# Altium footprint library THU VIEN V1.PcbLib: 400 footprints (part 13 of 25)
Each footprint in its own frame and in the unit in brackets; x right, y up, seen from the top. Pads: shape width x height; smd on the part's side, far side on the other; paste and mask are expansions set on the pad; w line width, h text height; cw(c..) or ccw(c..) is an arc to the next point about the centre after c.
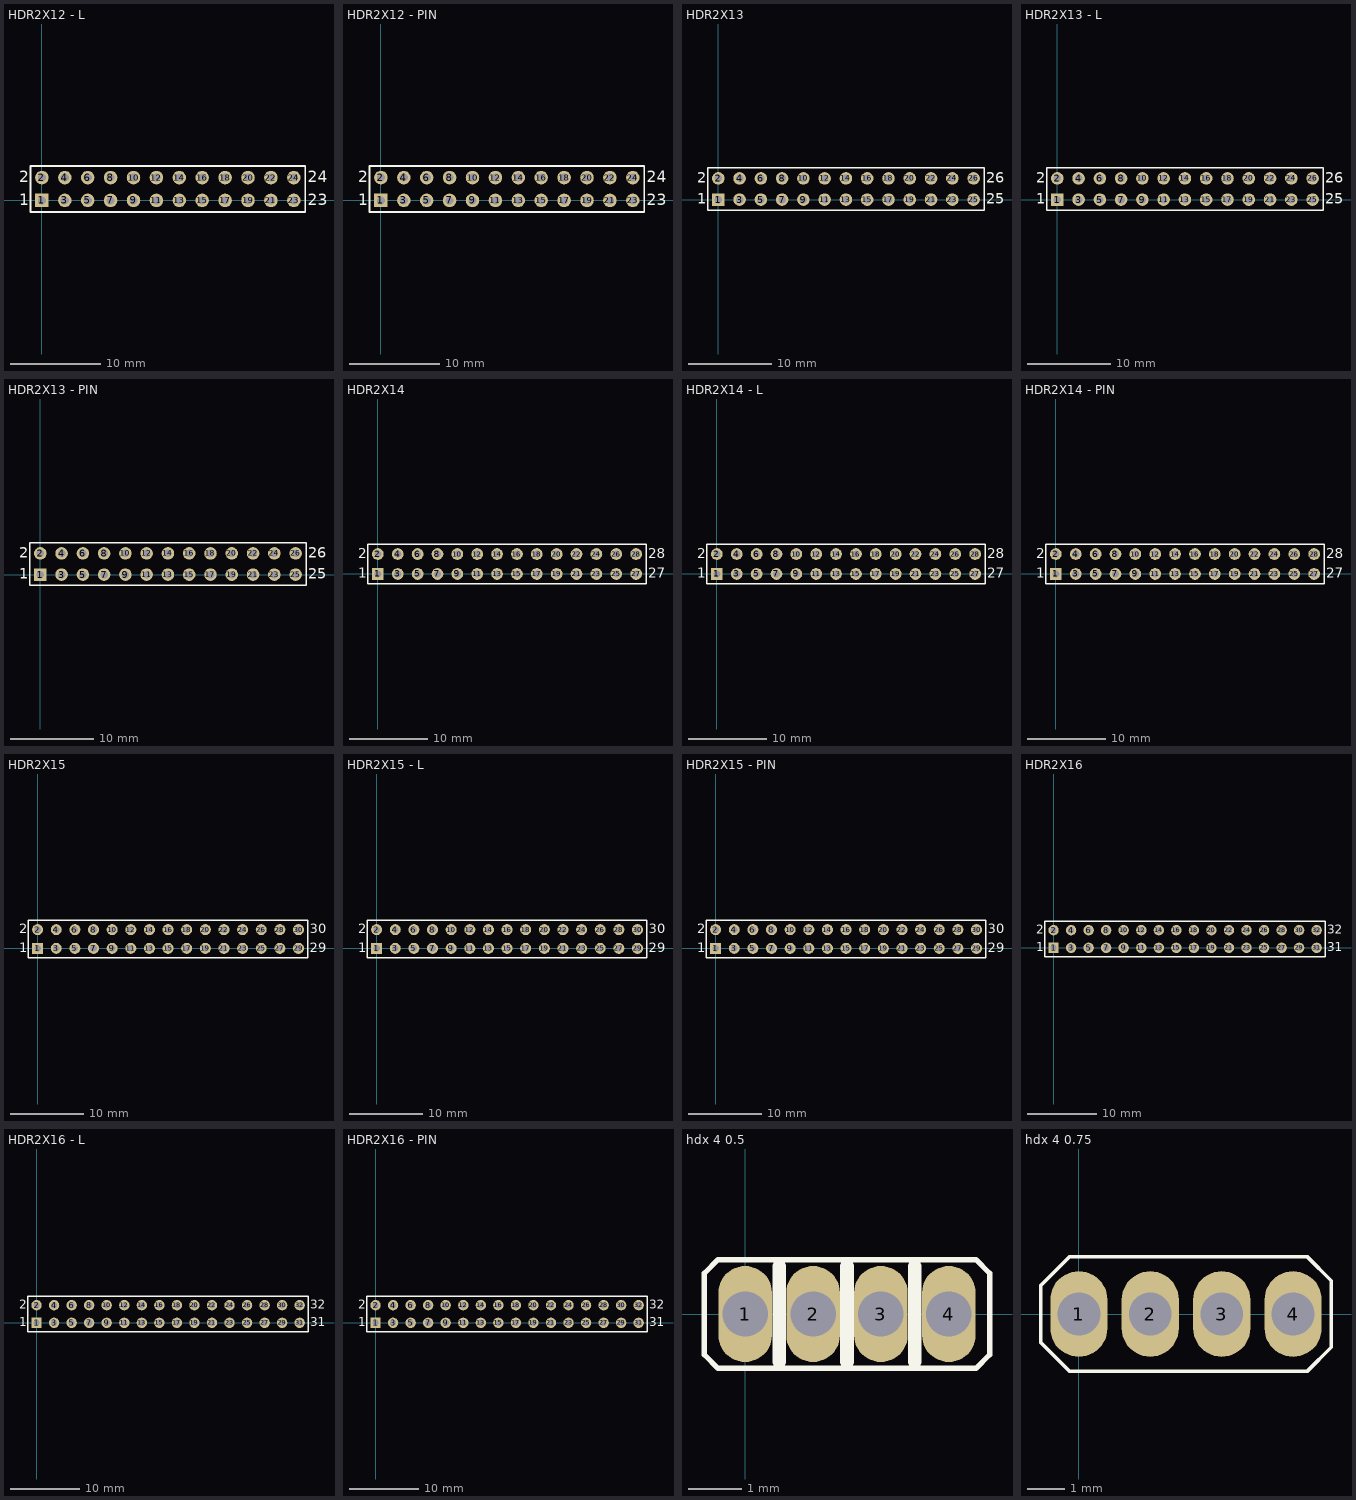
[diagram p12: the footprints below, top view; thin cyan lines are the x and y axes]

## HDR2X12 - L [mm] "Connector; Header; 12x2 Position"
pads (24):
  rect 1.5x1.5 hole 0.9: 1(0,0)
  round 1.5 hole 0.9: 2(0,2.54) 3(2.54,0) 4(2.54,2.54) 5(5.08,0) 6(5.08,2.54) 7(7.62,0) 8(7.62,2.54) 9(10.16,0) 10(10.16,2.54) 11(12.7,0) 12(12.7,2.54) 13(15.24,0) 14(15.24,2.54) 15(17.78,0) 16(17.78,2.54) 17(20.32,0) 18(20.32,2.54) 19(22.86,0) 20(22.86,2.54) 21(25.4,0) 22(25.4,2.54) 23(27.94,0) 24(27.94,2.54)
Top Overlay:
  lines w0.2: -1.27,-1.27 29.21,-1.27 29.21,3.81 -1.27,3.81 -1.27,-1.27
  text "24" at 29.464,2.032 h1.27
  text "23" at 29.464,-0.508 h1.27
  text "2" at -2.54,2.032 h1.27
  text "1" at -2.54,-0.508 h1.27
3D body: height 3.2, standoff -5.08, extent 26.594,-9.435 29.134,2.984
3D body: height 3.2, standoff -5.08, extent 24.054,-9.435 26.594,2.984
3D body: height 3.2, standoff -5.08, extent 21.514,-9.435 24.054,2.984
3D body: height 3.2, standoff -5.08, extent 18.974,-9.435 21.514,2.984
3D body: height 3.2, standoff -5.08, extent 16.459,-9.435 18.999,2.984
3D body: height 3.2, standoff -5.08, extent 13.97,-9.435 16.51,2.984
3D body: height 3.2, standoff -5.08, extent 11.43,-9.435 13.97,2.984
3D body: height 3.2, standoff -5.08, extent 8.915,-9.435 11.455,2.984
3D body: height 3.2, standoff -5.08, extent 6.375,-9.435 8.915,2.984
3D body: height 3.2, standoff -5.08, extent 3.861,-9.435 6.401,2.984
3D body: height 3.2, standoff -5.08, extent 1.346,-9.435 3.886,2.984
3D body: height 3.2, standoff -5.08, extent -1.143,-9.435 1.397,2.984

## HDR2X12 - PIN [mm] "Connector; Header; 12x2 Position"
pads (24):
  rect 1.5x1.5 hole 0.9: 1(0,0)
  round 1.5 hole 0.9: 2(0,2.54) 3(2.54,0) 4(2.54,2.54) 5(5.08,0) 6(5.08,2.54) 7(7.62,0) 8(7.62,2.54) 9(10.16,0) 10(10.16,2.54) 11(12.7,0) 12(12.7,2.54) 13(15.24,0) 14(15.24,2.54) 15(17.78,0) 16(17.78,2.54) 17(20.32,0) 18(20.32,2.54) 19(22.86,0) 20(22.86,2.54) 21(25.4,0) 22(25.4,2.54) 23(27.94,0) 24(27.94,2.54)
Top Overlay:
  lines w0.2: -1.27,-1.27 -1.27,3.81 29.21,3.81 29.21,-1.27 -1.27,-1.27
  text "1" at -2.54,-0.508 h1.27
  text "2" at -2.54,2.032 h1.27
  text "23" at 29.464,-0.508 h1.27
  text "24" at 29.464,2.032 h1.27
3D body: height 6.02, standoff -3.1, extent 26.543,-1.27 29.083,3.81
3D body: height 6.02, standoff -3.1, extent 24.003,-1.27 26.543,3.81
3D body: height 6.02, standoff -3.1, extent 21.463,-1.27 24.003,3.81
3D body: height 6.02, standoff -3.1, extent 18.948,-1.27 21.488,3.81
3D body: height 6.02, standoff -3.1, extent 16.408,-1.27 18.948,3.81
3D body: height 6.02, standoff -3.1, extent 13.868,-1.27 16.408,3.81
3D body: height 6.02, standoff -3.1, extent 11.354,-1.27 13.894,3.81
3D body: height 6.02, standoff -3.1, extent 8.839,-1.27 11.379,3.81
3D body: height 6.02, standoff -3.1, extent 6.325,-1.27 8.865,3.81
3D body: height 6.02, standoff -3.1, extent 3.81,-1.27 6.35,3.81
3D body: height 6.02, standoff -3.1, extent 1.27,-1.27 3.81,3.81
3D body: height 6.02, standoff -3.1, extent -1.245,-1.27 1.295,3.81

## HDR2X13 [mm] "Connector; Header; 13x2 Position"
pads (26):
  rect 1.5x1.5 hole 0.9: 1(0,0)
  round 1.5 hole 0.9: 2(0,2.54) 3(2.54,0) 4(2.54,2.54) 5(5.08,0) 6(5.08,2.54) 7(7.62,0) 8(7.62,2.54) 9(10.16,0) 10(10.16,2.54) 11(12.7,0) 12(12.7,2.54) 13(15.24,0) 14(15.24,2.54) 15(17.78,0) 16(17.78,2.54) 17(20.32,0) 18(20.32,2.54) 19(22.86,0) 20(22.86,2.54) 21(25.4,0) 22(25.4,2.54) 23(27.94,0) 24(27.94,2.54) 25(30.48,0) 26(30.48,2.54)
Top Overlay:
  lines w0.2: -1.27,-1.27 31.75,-1.27 31.75,3.81 -1.27,3.81 -1.27,-1.27
  text "26" at 32.004,2.032 h1.27
  text "25" at 32.004,-0.508 h1.27
  text "1" at -2.54,-0.508 h1.27
  text "2" at -2.54,2.032 h1.27
3D body: height 8.4, standoff -3, extent 18.974,-1.23 31.674,3.77
3D body: height 8.4, standoff -3, extent 6.274,-1.23 18.974,3.77
3D body: height 8.4, standoff -3, extent -1.321,-1.23 6.299,3.77

## HDR2X13 - L [mm] "Connector; Header; 13x2 Position"
pads (26):
  rect 1.5x1.5 hole 0.9: 1(0,0)
  round 1.5 hole 0.9: 2(0,2.54) 3(2.54,0) 4(2.54,2.54) 5(5.08,0) 6(5.08,2.54) 7(7.62,0) 8(7.62,2.54) 9(10.16,0) 10(10.16,2.54) 11(12.7,0) 12(12.7,2.54) 13(15.24,0) 14(15.24,2.54) 15(17.78,0) 16(17.78,2.54) 17(20.32,0) 18(20.32,2.54) 19(22.86,0) 20(22.86,2.54) 21(25.4,0) 22(25.4,2.54) 23(27.94,0) 24(27.94,2.54) 25(30.48,0) 26(30.48,2.54)
Top Overlay:
  lines w0.2: -1.27,-1.27 31.75,-1.27 31.75,3.81 -1.27,3.81 -1.27,-1.27
  text "26" at 32.004,2.032 h1.27
  text "25" at 32.004,-0.508 h1.27
  text "1" at -2.54,-0.508 h1.27
  text "2" at -2.54,2.032 h1.27
3D body: height 3.2, standoff -5.08, extent 29.134,-9.41 31.674,3.009
3D body: height 3.2, standoff -5.08, extent 26.619,-9.41 29.159,3.009
3D body: height 3.2, standoff -5.08, extent 24.079,-9.41 26.619,3.009
3D body: height 3.2, standoff -5.08, extent 21.539,-9.41 24.079,3.009
3D body: height 3.2, standoff -5.08, extent 18.999,-9.41 21.539,3.009
3D body: height 3.2, standoff -5.08, extent 16.459,-9.41 18.999,3.009
3D body: height 3.2, standoff -5.08, extent 13.97,-9.41 16.51,3.009
3D body: height 3.2, standoff -5.08, extent 11.43,-9.41 13.97,3.009
3D body: height 3.2, standoff -5.08, extent 8.89,-9.41 11.43,3.009
3D body: height 3.2, standoff -5.08, extent 6.35,-9.41 8.89,3.009
3D body: height 3.2, standoff -5.08, extent 3.81,-9.41 6.35,3.009
3D body: height 3.2, standoff -5.08, extent 1.321,-9.41 3.861,3.009
3D body: height 3.2, standoff -5.08, extent -1.219,-9.41 1.321,3.009

## HDR2X13 - PIN [mm] "Connector; Header; 13x2 Position"
pads (26):
  rect 1.5x1.5 hole 0.9: 1(0,0)
  round 1.5 hole 0.9: 2(0,2.54) 3(2.54,0) 4(2.54,2.54) 5(5.08,0) 6(5.08,2.54) 7(7.62,0) 8(7.62,2.54) 9(10.16,0) 10(10.16,2.54) 11(12.7,0) 12(12.7,2.54) 13(15.24,0) 14(15.24,2.54) 15(17.78,0) 16(17.78,2.54) 17(20.32,0) 18(20.32,2.54) 19(22.86,0) 20(22.86,2.54) 21(25.4,0) 22(25.4,2.54) 23(27.94,0) 24(27.94,2.54) 25(30.48,0) 26(30.48,2.54)
Top Overlay:
  lines w0.2: -1.27,-1.27 31.75,-1.27 31.75,3.81 -1.27,3.81 -1.27,-1.27
  text "26" at 32.004,2.032 h1.27
  text "25" at 32.004,-0.508 h1.27
  text "1" at -2.54,-0.508 h1.27
  text "2" at -2.54,2.032 h1.27
3D body: height 6.02, standoff -3.1, extent -1.245,-1.27 1.295,3.81
3D body: height 6.02, standoff -3.1, extent 1.295,-1.27 3.835,3.81
3D body: height 6.02, standoff -3.1, extent 3.835,-1.27 6.375,3.81
3D body: height 6.02, standoff -3.1, extent 6.375,-1.27 8.915,3.81
3D body: height 6.02, standoff -3.1, extent 8.915,-1.27 11.455,3.81
3D body: height 6.02, standoff -3.1, extent 11.455,-1.27 13.995,3.81
3D body: height 6.02, standoff -3.1, extent 13.995,-1.27 16.535,3.81
3D body: height 6.02, standoff -3.1, extent 16.535,-1.27 19.075,3.81
3D body: height 6.02, standoff -3.1, extent 19.025,-1.27 21.565,3.81
3D body: height 6.02, standoff -3.1, extent 21.488,-1.27 24.028,3.81
3D body: height 6.02, standoff -3.1, extent 24.028,-1.27 26.568,3.81
3D body: height 6.02, standoff -3.1, extent 26.568,-1.27 29.108,3.81
3D body: height 6.02, standoff -3.1, extent 29.108,-1.27 31.648,3.81

## HDR2X14 [mm] "Connector; Header; 14x2 Position"
pads (28):
  rect 1.5x1.5 hole 0.9: 1(0,0)
  round 1.5 hole 0.9: 2(0,2.54) 3(2.54,0) 4(2.54,2.54) 5(5.08,0) 6(5.08,2.54) 7(7.62,0) 8(7.62,2.54) 9(10.16,0) 10(10.16,2.54) 11(12.7,0) 12(12.7,2.54) 13(15.24,0) 14(15.24,2.54) 15(17.78,0) 16(17.78,2.54) 17(20.32,0) 18(20.32,2.54) 19(22.86,0) 20(22.86,2.54) 21(25.4,0) 22(25.4,2.54) 23(27.94,0) 24(27.94,2.54) 25(30.48,0) 26(30.48,2.54) 27(33.02,0) 28(33.02,2.54)
Top Overlay:
  lines w0.2: -1.27,-1.27 -1.27,3.81 34.29,3.81 34.29,-1.27 -1.27,-1.27
  text "2" at -2.54,2.032 h1.27
  text "1" at -2.54,-0.508 h1.27
  text "27" at 34.544,-0.508 h1.27
  text "28" at 34.544,2.032 h1.27
3D body: height 8.4, standoff -3, extent 21.615,-1.23 34.315,3.77
3D body: height 8.4, standoff -3, extent 8.915,-1.23 21.615,3.77
3D body: height 8.4, standoff -3, extent -1.27,-1.23 8.89,3.77

## HDR2X14 - L [mm] "Connector; Header; 14x2 Position"
pads (28):
  rect 1.5x1.5 hole 0.9: 1(0,0)
  round 1.5 hole 0.9: 2(0,2.54) 3(2.54,0) 4(2.54,2.54) 5(5.08,0) 6(5.08,2.54) 7(7.62,0) 8(7.62,2.54) 9(10.16,0) 10(10.16,2.54) 11(12.7,0) 12(12.7,2.54) 13(15.24,0) 14(15.24,2.54) 15(17.78,0) 16(17.78,2.54) 17(20.32,0) 18(20.32,2.54) 19(22.86,0) 20(22.86,2.54) 21(25.4,0) 22(25.4,2.54) 23(27.94,0) 24(27.94,2.54) 25(30.48,0) 26(30.48,2.54) 27(33.02,0) 28(33.02,2.54)
Top Overlay:
  lines w0.2: -1.27,-1.27 34.29,-1.27 34.29,3.81 -1.27,3.81 -1.27,-1.27
  text "28" at 34.544,2.032 h1.27
  text "27" at 34.544,-0.508 h1.27
  text "1" at -2.54,-0.508 h1.27
  text "2" at -2.54,2.032 h1.27
3D body: height 3.2, standoff -5.08, extent 31.674,-9.537 34.214,2.882
3D body: height 3.2, standoff -5.08, extent 29.159,-9.537 31.699,2.882
3D body: height 3.2, standoff -5.08, extent 26.619,-9.537 29.159,2.882
3D body: height 3.2, standoff -5.08, extent 24.105,-9.537 26.645,2.882
3D body: height 3.2, standoff -5.08, extent 21.565,-9.537 24.105,2.882
3D body: height 3.2, standoff -5.08, extent 19.025,-9.537 21.565,2.882
3D body: height 3.2, standoff -5.08, extent 16.485,-9.537 19.025,2.882
3D body: height 3.2, standoff -5.08, extent 13.945,-9.537 16.485,2.882
3D body: height 3.2, standoff -5.08, extent 11.405,-9.537 13.945,2.882
3D body: height 3.2, standoff -5.08, extent 8.865,-9.537 11.405,2.882
3D body: height 3.2, standoff -5.08, extent 6.325,-9.537 8.865,2.882
3D body: height 3.2, standoff -5.08, extent 3.785,-9.537 6.325,2.882
3D body: height 3.2, standoff -5.08, extent 1.295,-9.537 3.835,2.882
3D body: height 3.2, standoff -5.08, extent -1.194,-9.537 1.346,2.882

## HDR2X14 - PIN [mm] "Connector; Header; 14x2 Position"
pads (28):
  rect 1.5x1.5 hole 0.9: 1(0,0)
  round 1.5 hole 0.9: 2(0,2.54) 3(2.54,0) 4(2.54,2.54) 5(5.08,0) 6(5.08,2.54) 7(7.62,0) 8(7.62,2.54) 9(10.16,0) 10(10.16,2.54) 11(12.7,0) 12(12.7,2.54) 13(15.24,0) 14(15.24,2.54) 15(17.78,0) 16(17.78,2.54) 17(20.32,0) 18(20.32,2.54) 19(22.86,0) 20(22.86,2.54) 21(25.4,0) 22(25.4,2.54) 23(27.94,0) 24(27.94,2.54) 25(30.48,0) 26(30.48,2.54) 27(33.02,0) 28(33.02,2.54)
Top Overlay:
  lines w0.2: -1.27,-1.27 -1.27,3.81 34.29,3.81 34.29,-1.27 -1.27,-1.27
  text "2" at -2.54,2.032 h1.27
  text "1" at -2.54,-0.508 h1.27
  text "27" at 34.544,-0.508 h1.27
  text "28" at 34.544,2.032 h1.27
3D body: height 6.02, standoff -3.1, extent -1.168,-1.27 1.372,3.81
3D body: height 6.02, standoff -3.1, extent 1.346,-1.27 3.886,3.81
3D body: height 6.02, standoff -3.1, extent 3.861,-1.27 6.401,3.81
3D body: height 6.02, standoff -3.1, extent 6.401,-1.27 8.941,3.81
3D body: height 6.02, standoff -3.1, extent 8.915,-1.27 11.455,3.81
3D body: height 6.02, standoff -3.1, extent 11.455,-1.27 13.995,3.81
3D body: height 6.02, standoff -3.1, extent 13.995,-1.27 16.535,3.81
3D body: height 6.02, standoff -3.1, extent 16.535,-1.27 19.075,3.81
3D body: height 6.02, standoff -3.1, extent 19.075,-1.27 21.615,3.81
3D body: height 6.02, standoff -3.1, extent 21.615,-1.27 24.155,3.81
3D body: height 6.02, standoff -3.1, extent 24.105,-1.27 26.645,3.81
3D body: height 6.02, standoff -3.1, extent 26.619,-1.27 29.159,3.81
3D body: height 6.02, standoff -3.1, extent 29.134,-1.27 31.674,3.81
3D body: height 6.02, standoff -3.1, extent 31.648,-1.27 34.188,3.81

## HDR2X15 [mm] "Connector; Header; 15x2 Position"
pads (30):
  rect 1.5x1.5 hole 0.9: 1(0,0)
  round 1.5 hole 0.9: 2(0,2.54) 3(2.54,0) 4(2.54,2.54) 5(5.08,0) 6(5.08,2.54) 7(7.62,0) 8(7.62,2.54) 9(10.16,0) 10(10.16,2.54) 11(12.7,0) 12(12.7,2.54) 13(15.24,0) 14(15.24,2.54) 15(17.78,0) 16(17.78,2.54) 17(20.32,0) 18(20.32,2.54) 19(22.86,0) 20(22.86,2.54) 21(25.4,0) 22(25.4,2.54) 23(27.94,0) 24(27.94,2.54) 25(30.48,0) 26(30.48,2.54) 27(33.02,0) 28(33.02,2.54) 29(35.56,0) 30(35.56,2.54)
Top Overlay:
  lines w0.2: -1.27,-1.27 -1.27,3.81 36.83,3.81 36.83,-1.27 -1.27,-1.27
  text "30" at 37.084,2.032 h1.27
  text "29" at 37.084,-0.508 h1.27
  text "2" at -2.54,2.032 h1.27
  text "1" at -2.54,-0.508 h1.27
3D body: height 8.4, standoff -3, extent 24.054,-1.23 36.754,3.77
3D body: height 8.4, standoff -3, extent 11.328,-1.23 24.028,3.77
3D body: height 8.4, standoff -3, extent -1.244,-1.23 11.456,3.77

## HDR2X15 - L [mm] "Connector; Header; 15x2 Position"
pads (30):
  rect 1.5x1.5 hole 0.9: 1(0,0)
  round 1.5 hole 0.9: 2(0,2.54) 3(2.54,0) 4(2.54,2.54) 5(5.08,0) 6(5.08,2.54) 7(7.62,0) 8(7.62,2.54) 9(10.16,0) 10(10.16,2.54) 11(12.7,0) 12(12.7,2.54) 13(15.24,0) 14(15.24,2.54) 15(17.78,0) 16(17.78,2.54) 17(20.32,0) 18(20.32,2.54) 19(22.86,0) 20(22.86,2.54) 21(25.4,0) 22(25.4,2.54) 23(27.94,0) 24(27.94,2.54) 25(30.48,0) 26(30.48,2.54) 27(33.02,0) 28(33.02,2.54) 29(35.56,0) 30(35.56,2.54)
Top Overlay:
  lines w0.2: -1.27,-1.27 -1.27,3.81 36.83,3.81 36.83,-1.27 -1.27,-1.27
  text "30" at 37.084,2.032 h1.27
  text "29" at 37.084,-0.508 h1.27
  text "2" at -2.54,2.032 h1.27
  text "1" at -2.54,-0.508 h1.27
3D body: height 3.2, standoff -5.08, extent 34.188,-9.384 36.728,3.034
3D body: height 3.2, standoff -5.08, extent 31.648,-9.41 34.188,3.009
3D body: height 3.2, standoff -5.08, extent 29.134,-9.384 31.674,3.034
3D body: height 3.2, standoff -5.08, extent 26.645,-9.384 29.185,3.034
3D body: height 3.2, standoff -5.08, extent 24.105,-9.384 26.645,3.034
3D body: height 3.2, standoff -5.08, extent 21.565,-9.384 24.105,3.034
3D body: height 3.2, standoff -5.08, extent 19.025,-9.384 21.565,3.034
3D body: height 3.2, standoff -5.08, extent 16.485,-9.384 19.025,3.034
3D body: height 3.2, standoff -5.08, extent 13.97,-9.384 16.51,3.034
3D body: height 3.2, standoff -5.08, extent 11.43,-9.384 13.97,3.034
3D body: height 3.2, standoff -5.08, extent 8.89,-9.384 11.43,3.034
3D body: height 3.2, standoff -5.08, extent 6.401,-9.384 8.941,3.034
3D body: height 3.2, standoff -5.08, extent 3.861,-9.384 6.401,3.034
3D body: height 3.2, standoff -5.08, extent 1.321,-9.384 3.861,3.034
3D body: height 3.2, standoff -5.08, extent -1.219,-9.384 1.321,3.034

## HDR2X15 - PIN [mm] "Connector; Header; 15x2 Position"
pads (30):
  rect 1.5x1.5 hole 0.9: 1(0,0)
  round 1.5 hole 0.9: 2(0,2.54) 3(2.54,0) 4(2.54,2.54) 5(5.08,0) 6(5.08,2.54) 7(7.62,0) 8(7.62,2.54) 9(10.16,0) 10(10.16,2.54) 11(12.7,0) 12(12.7,2.54) 13(15.24,0) 14(15.24,2.54) 15(17.78,0) 16(17.78,2.54) 17(20.32,0) 18(20.32,2.54) 19(22.86,0) 20(22.86,2.54) 21(25.4,0) 22(25.4,2.54) 23(27.94,0) 24(27.94,2.54) 25(30.48,0) 26(30.48,2.54) 27(33.02,0) 28(33.02,2.54) 29(35.56,0) 30(35.56,2.54)
Top Overlay:
  lines w0.2: -1.27,-1.27 -1.27,3.81 36.83,3.81 36.83,-1.27 -1.27,-1.27
  text "30" at 37.084,2.032 h1.27
  text "29" at 37.084,-0.508 h1.27
  text "2" at -2.54,2.032 h1.27
  text "1" at -2.54,-0.508 h1.27
3D body: height 6.02, standoff -3.1, extent -1.143,-1.27 1.397,3.81
3D body: height 6.02, standoff -3.1, extent 1.372,-1.27 3.912,3.81
3D body: height 6.02, standoff -3.1, extent 3.886,-1.27 6.426,3.81
3D body: height 6.02, standoff -3.1, extent 6.426,-1.27 8.966,3.81
3D body: height 6.02, standoff -3.1, extent 8.966,-1.27 11.506,3.81
3D body: height 6.02, standoff -3.1, extent 11.506,-1.27 14.046,3.81
3D body: height 6.02, standoff -3.1, extent 14.021,-1.27 16.561,3.81
3D body: height 6.02, standoff -3.1, extent 16.561,-1.27 19.101,3.81
3D body: height 6.02, standoff -3.1, extent 19.05,-1.27 21.59,3.81
3D body: height 6.02, standoff -3.1, extent 21.59,-1.27 24.13,3.81
3D body: height 6.02, standoff -3.1, extent 24.13,-1.27 26.67,3.81
3D body: height 6.02, standoff -3.1, extent 26.645,-1.27 29.185,3.81
3D body: height 6.02, standoff -3.1, extent 29.159,-1.27 31.699,3.81
3D body: height 6.02, standoff -3.1, extent 31.699,-1.27 34.239,3.81
3D body: height 6.02, standoff -3.1, extent 34.239,-1.27 36.779,3.81

## HDR2X16 [mm] "Connector; Header; 16x2 Position"
pads (32):
  rect 1.5x1.5 hole 0.9: 1(0,0)
  round 1.5 hole 0.9: 2(0,2.54) 3(2.54,0) 4(2.54,2.54) 5(5.08,0) 6(5.08,2.54) 7(7.62,0) 8(7.62,2.54) 9(10.16,0) 10(10.16,2.54) 11(12.7,0) 12(12.7,2.54) 13(15.24,0) 14(15.24,2.54) 15(17.78,0) 16(17.78,2.54) 17(20.32,0) 18(20.32,2.54) 19(22.86,0) 20(22.86,2.54) 21(25.4,0) 22(25.4,2.54) 23(27.94,0) 24(27.94,2.54) 25(30.48,0) 26(30.48,2.54) 27(33.02,0) 28(33.02,2.54) 29(35.56,0) 30(35.56,2.54) 31(38.1,0) 32(38.1,2.54)
Top Overlay:
  lines w0.2: -1.27,-1.27 -1.27,3.81 39.37,3.81 39.37,-1.27 -1.27,-1.27
  text "32" at 39.624,2.032 h1.27
  text "31" at 39.624,-0.508 h1.27
  text "1" at -2.54,-0.508 h1.27
  text "2" at -2.54,2.032 h1.27
3D body: height 8.4, standoff -3, extent -1.244,-1.23 19.076,3.77
3D body: height 8.4, standoff -3, extent 19.075,-1.23 39.395,3.77

## HDR2X16 - L [mm] "Connector; Header; 16x2 Position"
pads (32):
  rect 1.5x1.5 hole 0.9: 1(0,0)
  round 1.5 hole 0.9: 2(0,2.54) 3(2.54,0) 4(2.54,2.54) 5(5.08,0) 6(5.08,2.54) 7(7.62,0) 8(7.62,2.54) 9(10.16,0) 10(10.16,2.54) 11(12.7,0) 12(12.7,2.54) 13(15.24,0) 14(15.24,2.54) 15(17.78,0) 16(17.78,2.54) 17(20.32,0) 18(20.32,2.54) 19(22.86,0) 20(22.86,2.54) 21(25.4,0) 22(25.4,2.54) 23(27.94,0) 24(27.94,2.54) 25(30.48,0) 26(30.48,2.54) 27(33.02,0) 28(33.02,2.54) 29(35.56,0) 30(35.56,2.54) 31(38.1,0) 32(38.1,2.54)
Top Overlay:
  lines w0.2: -1.27,-1.27 39.37,-1.27 39.37,3.81 -1.27,3.81 -1.27,-1.27
  text "2" at -2.54,2.032 h1.27
  text "1" at -2.54,-0.508 h1.27
  text "31" at 39.624,-0.508 h1.27
  text "32" at 39.624,2.032 h1.27
3D body: height 3.2, standoff -5.08, extent -1.118,-9.486 1.422,2.933
3D body: height 3.2, standoff -5.08, extent 1.372,-9.486 3.912,2.933
3D body: height 3.2, standoff -5.08, extent 3.912,-9.486 6.452,2.933
3D body: height 3.2, standoff -5.08, extent 6.452,-9.486 8.992,2.933
3D body: height 3.2, standoff -5.08, extent 8.992,-9.486 11.532,2.933
3D body: height 3.2, standoff -5.08, extent 11.506,-9.486 14.046,2.933
3D body: height 3.2, standoff -5.08, extent 14.021,-9.486 16.561,2.933
3D body: height 3.2, standoff -5.08, extent 16.561,-9.486 19.101,2.933
3D body: height 3.2, standoff -5.08, extent 19.101,-9.486 21.641,2.933
3D body: height 3.2, standoff -5.08, extent 21.615,-9.486 24.155,2.933
3D body: height 3.2, standoff -5.08, extent 24.155,-9.486 26.695,2.933
3D body: height 3.2, standoff -5.08, extent 26.695,-9.486 29.235,2.933
3D body: height 3.2, standoff -5.08, extent 29.185,-9.486 31.725,2.933
3D body: height 3.2, standoff -5.08, extent 31.674,-9.486 34.214,2.933
3D body: height 3.2, standoff -5.08, extent 34.163,-9.486 36.703,2.933
3D body: height 3.2, standoff -5.08, extent 36.678,-9.486 39.218,2.933

## HDR2X16 - PIN [mm] "Connector; Header; 16x2 Position"
pads (32):
  rect 1.5x1.5 hole 0.9: 1(0,0)
  round 1.5 hole 0.9: 2(0,2.54) 3(2.54,0) 4(2.54,2.54) 5(5.08,0) 6(5.08,2.54) 7(7.62,0) 8(7.62,2.54) 9(10.16,0) 10(10.16,2.54) 11(12.7,0) 12(12.7,2.54) 13(15.24,0) 14(15.24,2.54) 15(17.78,0) 16(17.78,2.54) 17(20.32,0) 18(20.32,2.54) 19(22.86,0) 20(22.86,2.54) 21(25.4,0) 22(25.4,2.54) 23(27.94,0) 24(27.94,2.54) 25(30.48,0) 26(30.48,2.54) 27(33.02,0) 28(33.02,2.54) 29(35.56,0) 30(35.56,2.54) 31(38.1,0) 32(38.1,2.54)
Top Overlay:
  lines w0.2: -1.27,-1.27 -1.27,3.81 39.37,3.81 39.37,-1.27 -1.27,-1.27
  text "32" at 39.624,2.032 h1.27
  text "31" at 39.624,-0.508 h1.27
  text "1" at -2.54,-0.508 h1.27
  text "2" at -2.54,2.032 h1.27
3D body: height 6.02, standoff -3.1, extent 36.805,-1.245 39.345,3.835
3D body: height 6.02, standoff -3.1, extent 34.265,-1.245 36.805,3.835
3D body: height 6.02, standoff -3.1, extent 31.725,-1.245 34.265,3.835
3D body: height 6.02, standoff -3.1, extent 29.185,-1.245 31.725,3.835
3D body: height 6.02, standoff -3.1, extent 26.721,-1.245 29.261,3.835
3D body: height 6.02, standoff -3.1, extent 24.206,-1.245 26.746,3.835
3D body: height 6.02, standoff -3.1, extent 21.692,-1.245 24.232,3.835
3D body: height 6.02, standoff -3.1, extent 19.202,-1.245 21.742,3.835
3D body: height 6.02, standoff -3.1, extent 16.662,-1.245 19.202,3.835
3D body: height 6.02, standoff -3.1, extent 14.122,-1.245 16.662,3.835
3D body: height 6.02, standoff -3.1, extent 11.582,-1.245 14.122,3.835
3D body: height 6.02, standoff -3.1, extent 9.042,-1.245 11.582,3.835
3D body: height 6.02, standoff -3.1, extent 6.502,-1.245 9.042,3.835
3D body: height 6.02, standoff -3.1, extent 3.962,-1.245 6.502,3.835
3D body: height 6.02, standoff -3.1, extent 1.422,-1.245 3.962,3.835
3D body: height 6.02, standoff -3.1, extent -1.118,-1.245 1.422,3.835

## hdx 4 0.5 [mm]
pads (4):
  oval 1x1.8 hole 0.85: 1(0,0) 2(1.27,0) 3(2.54,0) 4(3.81,0)
Top Overlay:
  lines w0.1: -0.762,-0.762 -0.508,-1.016 4.318,-1.016 4.572,-0.762 4.572,0.762 4.318,1.016 -0.508,1.016 -0.762,0.762 -0.762,-0.762
  lines w0.254: 0.635,-0.889 0.635,0.889 ; 1.905,-0.889 1.905,0.889 ; 3.175,-0.889 3.175,0.889

## hdx 4 0.75 [mil]
pads (4):
  oval 60x90 hole 45: 1(0,0) 2(75,0) 3(150,0) 4(225,0)
Top Overlay:
  lines w3.94: -40,-30 -10,-60 240,-60 265,-35 265,35 240,60 -10,60 -40,30 -40,-30